# Altium footprint library 2022_AESK_UAV.PcbLib: 25 footprints (part 1 of 2)
Each footprint in its own frame and in the unit in brackets; x right, y up, seen from the top. Pads: shape width x height; smd on the part's side, far side on the other; paste and mask are expansions set on the pad; w line width, h text height; cw(c..) or ccw(c..) is an arc to the next point about the centre after c.
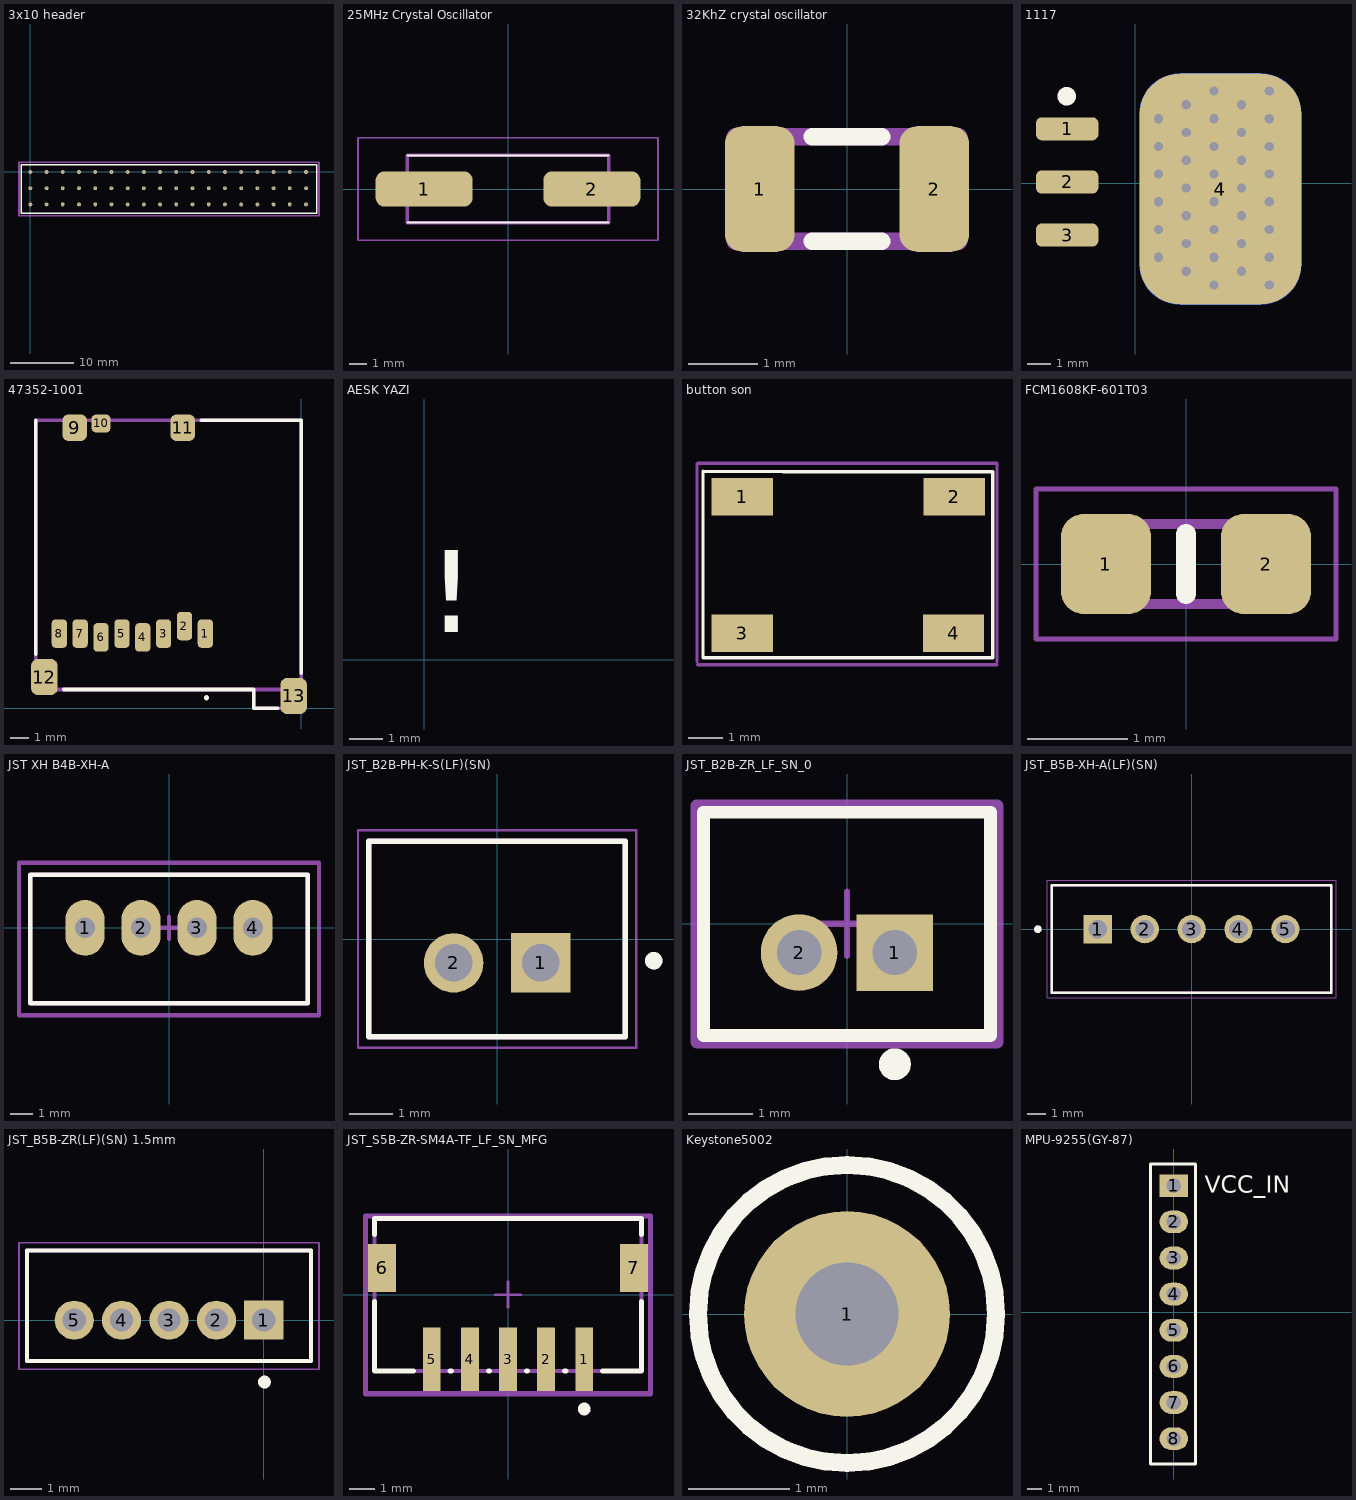
[diagram p0: the footprints below, top view; thin cyan lines are the x and y axes]

## 3x10 header [mm]
pads (55):
  round 0.6 hole 0.3 paste+0: 1(0,0) 1(0,0) 2(2.54,0) 3(5.08,0) 4(7.62,0) 5(10.16,0) 6(12.7,0) 7(15.24,0) 8(17.78,0) 9(20.32,0) 10(22.86,0) 11(25.4,0) 12(27.94,0) 13(30.48,0) 14(33.02,0) 15(35.56,0) 16(38.1,0) 17(40.64,0) 18(43.18,0) 19(0,-2.54) 20(2.54,-2.54) 21(5.08,-2.54) 22(7.62,-2.54) 23(10.16,-2.54) 24(12.7,-2.54) 25(15.24,-2.54) 26(17.78,-2.54) 27(20.32,-2.54) 28(22.86,-2.54) 29(25.4,-2.54) 30(27.94,-2.54) 31(30.48,-2.54) 32(33.02,-2.54) 33(35.56,-2.54) 34(38.1,-2.54) 35(40.64,-2.54) 36(43.18,-2.54) 37(0,-5.08) 38(2.54,-5.08) 39(5.08,-5.08) 40(7.62,-5.08) 41(10.16,-5.08) 42(12.7,-5.08) 43(15.24,-5.08) 44(17.78,-5.08) 45(20.32,-5.08) 46(22.86,-5.08) 47(25.4,-5.08) 48(27.94,-5.08) 49(30.48,-5.08) 50(33.02,-5.08) 51(35.56,-5.08) 52(38.1,-5.08) 53(40.64,-5.08) 54(43.18,-5.08)
Top Overlay:
  lines w0.254: -1.397,-6.477 44.831,-6.477 44.831,1.143 -1.397,1.143 -1.397,-6.477
Mechanical 15:
  lines w0.254: -1.778,-6.858 45.085,-6.858 45.212,-6.858 45.212,1.524 -1.778,1.524 -1.778,-6.858

## 25MHz Crystal Oscillator [mm]
pads (2):
  rrect50% 5.5x2 smd: 1(-4.75,0) 2(4.75,0)
Top Overlay:
  lines w0.1: -5.7,-1.9 5.7,-1.9 ; -5.7,1.9 5.7,1.9
Mechanical 13:
  lines w0.2: -5.7,-1.9 5.7,-1.9 5.7,1.9 -5.7,1.9 -5.7,-1.9
Mechanical 15:
  lines w0.1: -8.5,-2.9 8.5,-2.9 8.5,2.9 -8.5,2.9 -8.5,-2.9
3D body "ECS-250-18-5PX-F-TR.stp": height 4.4, standoff 0, extent -7.3,-1.9 7.3,1.9

## 32KhZ crystal oscillator [mm]
pads (2):
  rrect50% 1x1.8 smd: 1(-1.25,0) 2(1.25,0)
Top Overlay:
  lines w0.254: -0.5,-0.75 0.5,-0.75 ; -0.5,0.75 0.5,0.75
Mechanical 13:
  lines w0.254: -1.6,-0.75 1.6,-0.75 1.6,0.75 -1.6,0.75 -1.6,-0.75
3D body "User Library-NDK_NX3215SA.STEP": height 0.8, standoff 0, extent -1.6,-0.75 1.6,0.75

## 1117 [mm]
pads (5):
  rrect50% 2.7x1 smd paste-0.102 mask+0.051: 1(-2.95,2.351) 2(-2.95,0.051) 3(-2.95,-2.249)
  rrect50% 7x10 smd paste-0.102 mask+0.051: 4(3.683,-0.254)
  rrect50% 7x10 smd far side paste-0.102 mask+0.051: 4(3.683,-0.254)
via 2.198,3.39 diameter 0.8 hole 0.4
via 3.398,3.99 diameter 0.8 hole 0.4
via 4.598,3.39 diameter 0.8 hole 0.4
via 5.798,3.99 diameter 0.8 hole 0.4
via 0.998,2.79 diameter 0.8 hole 0.4
via 2.198,2.19 diameter 0.8 hole 0.4
via 3.398,2.79 diameter 0.8 hole 0.4
via 4.598,2.19 diameter 0.8 hole 0.4
via 5.798,2.79 diameter 0.8 hole 0.4
via 0.998,1.59 diameter 0.8 hole 0.4
via 2.198,0.99 diameter 0.8 hole 0.4
via 3.398,1.59 diameter 0.8 hole 0.4
via 4.598,0.99 diameter 0.8 hole 0.4
via 5.798,1.59 diameter 0.8 hole 0.4
via 0.998,0.39 diameter 0.8 hole 0.4
via 2.198,-0.21 diameter 0.8 hole 0.4
via 3.398,0.39 diameter 0.8 hole 0.4
via 4.598,-0.21 diameter 0.8 hole 0.4
via 5.798,0.39 diameter 0.8 hole 0.4
via 0.998,-0.81 diameter 0.8 hole 0.4
via 2.198,-1.41 diameter 0.8 hole 0.4
via 3.398,-0.81 diameter 0.8 hole 0.4
via 4.598,-1.41 diameter 0.8 hole 0.4
via 5.798,-0.81 diameter 0.8 hole 0.4
via 0.998,-2.01 diameter 0.8 hole 0.4
via 2.198,-2.61 diameter 0.8 hole 0.4
via 3.398,-2.01 diameter 0.8 hole 0.4
via 4.598,-2.61 diameter 0.8 hole 0.4
via 5.798,-2.01 diameter 0.8 hole 0.4
via 0.998,-3.21 diameter 0.8 hole 0.4
via 2.198,-3.81 diameter 0.8 hole 0.4
via 3.398,-3.21 diameter 0.8 hole 0.4
via 4.598,-3.81 diameter 0.8 hole 0.4
via 5.798,-3.21 diameter 0.8 hole 0.4
via 3.398,-4.41 diameter 0.8 hole 0.4
via 5.798,-4.41 diameter 0.8 hole 0.4
Top Overlay:
  circle w0.4: c-2.972,3.759 r0.2
3D body "SW3dPS-SOT-223-1.STEP": height 1.63, standoff -0.02, extent -3.754,-3.25 3.246,3.25

## 47352-1001 [mm]
pads (13):
  rrect50% 0.8x1.5 smd: 1(-5.06,3.94) 2(-6.16,4.34) 3(-7.26,3.94) 4(-8.36,3.74) 5(-9.46,3.94) 6(-10.56,3.74) 7(-11.66,3.94) 8(-12.76,3.94)
  rrect50% 1.3x1.4 smd: 9(-11.95,14.8) 11(-6.25,14.8)
  rrect50% 1x0.95 smd: 10(-10.56,15.025)
  rrect50% 1.4x1.9 smd: 12(-13.55,1.65) 13(-0.4,0.65)
Top Overlay:
  circle w0.2: c-4.994,0.556 r0.034
  lines w0.2: -14,2.872 -14,15.2 ; -12.526,1 -2.5,1 -2.5,0 -1.25,0 ; -5.273,15.2 0,15.2 0,1.858
Mechanical 13:
  lines w0.2: -2.5,1 -2.5,0 0,0 0,1 ; 0,1 -14,1 -14,15.2 0,15.2 0,1
3D body "473521001.stp": height 1.85, standoff -0.03, extent -14.035,0.04 0.065,15.24

## AESK YAZI [mm] "AESK YAZI"
Top Overlay:
  text "!" at 0.006,-0.127 h5

## button son [mm]
pads (4):
  rect 1.8x1.1 smd mask+0.05: 1(9.25,9.35) 2(15.475,9.35) 3(9.25,5.35) 4(15.45,5.35)
Top Overlay:
  lines w0.1: 16.6,10.075 14.3,10.075 10.45,10.075 8.1,10.1 8.1,4.625 16.6,4.625 16.6,10.075 ; 16.6,10.075 16.6,10.075
Mechanical 3:
  lines w0.1: 7.925,4.5 7.925,10.3 7.95,10.325 10.144,10.325 11.241,10.325 13.434,10.325 14.531,10.325 16.725,10.325 16.725,4.5 ; 7.95,4.425 10.5,4.425 14.2,4.425 15.45,4.425 ; 15.425,4.425 15.825,4.425 16.725,4.425
3D body "User Library-4x4_SMD_Switch.step": height 1.5, standoff 0, extent 9.05,4.775 15.45,9.975

## FCM1608KF-601T03 [mm]
pads (2):
  rrect50% 0.9x1 smd: 1(-0.8,0) 2(0.8,0)
Top Overlay:
  lines w0.2: 0,-0.3 0,0.3
Mechanical 13:
  lines w0.1: -0.8,-0.4 -0.8,0.4 0.8,0.4 0.8,-0.4 -0.8,-0.4
Mechanical 15:
  lines w0.05: -1.5,-0.75 -1.5,0.75 1.5,0.75 1.5,-0.75 -1.5,-0.75
3D body "FCM1608KF-601T03.stp": height 0.95, standoff 0, extent -0.8,-0.4 0.8,0.4

## JST XH B4B-XH-A [mm]
pads (4):
  oval 1.75x2.5 hole 0.9: 1(-3.75,0) 2(-1.25,0) 3(1.25,0) 4(3.75,0)
Top Overlay:
  lines w0.2: -6.2,-3.375 -6.2,2.375 6.2,2.375 6.2,-3.375 -6.2,-3.375
Mechanical 1:
  lines w0.2: -6.2,-3.375 6.2,-3.375 6.2,2.375 -6.2,2.375 -6.2,-3.375
Mechanical 15:
  lines w0.2: -0.5,0 0.5,0 ; 0,-0.5 0,0.5 ; -6.7,-3.9 -6.7,2.9 6.7,2.9 6.7,-3.9 -6.7,-3.9
3D body "JST B4B-XH-A.STEP": height 7, standoff -3.4, extent -6.2,-3.375 6.2,2.375

## JST_B2B-PH-K-S(LF)(SN) [mm]
pads (2):
  rect 1.368x1.368 hole 0.86: 1(1,-0.55)
  round 1.368 hole 0.86: 2(-1,-0.55)
Top Overlay:
  circle w0.2: c3.6,-0.5 r0.1
  lines w0.127: -2.95,-2.25 -2.95,2.25 2.95,2.25 2.95,-2.25 -2.95,-2.25
Mechanical 13:
  circle w0.2: c3.6,-0.5 r0.1
  lines w0.127: -2.95,-2.25 2.95,-2.25 2.95,2.25 -2.95,2.25 -2.95,-2.25
Mechanical 15:
  lines w0.05: -3.2,-2.5 3.2,-2.5 3.2,2.5 -3.2,2.5 -3.2,-2.5
3D body "B2B-PH-K-S(LF)(SN)--3DModel-STEP-56544.STEP": height 6, standoff -3.4, extent -2.95,-2.25 2.95,2.25

## JST_B2B-ZR_LF_SN_0 [mm]
pads (2):
  rect 1.2x1.2 hole 0.7 paste-1000 mask+0: 1(0.75,-0.45)
  round 1.2 hole 0.7 paste-1000 mask+0: 2(-0.75,-0.45)
Top Overlay:
  circle w0.25: c0.75,-2.2 r0.125
  lines w0.2: -2.25,-1.75 -2.25,1.75 2.25,1.75 2.25,-1.75 -2.25,-1.75
Mechanical 10:
  lines w0.2: -2.35,-1.85 -2.35,1.85 2.35,1.85 2.35,-1.85 -2.35,-1.85
  text ".Designator" at 0,0 h1
Mechanical 12:
  lines w0.15: -2.25,-1.75 -2.25,1.75 2.25,1.75 2.25,-1.75 -2.25,-1.75
Mechanical 15:
  lines w0.1: -0.5,0 0.5,0 ; 0,-0.5 0,0.5
  lines w0.2: -2.35,-1.85 -2.35,1.85 2.35,1.85 2.35,-1.85 -2.35,-1.85
3D body "Conn_JST_B2B-ZR_LF_SN_eec.STEP": height 0.25, standoff 0, extent -2.35,-1.85 2.35,1.85

## JST_B5B-XH-A(LF)(SN) [mm]
pads (5):
  rect 1.508x1.508 hole 1: 1(-5,0)
  round 1.508 hole 1: 2(-2.5,0) 3(0,0) 4(2.5,0) 5(5,0)
Top Overlay:
  circle w0.2: c-8.2,0 r0.1
  lines w0.127: -7.45,-3.4 7.45,-3.4 7.45,2.35 -7.45,2.35 -7.45,-3.4
Mechanical 13:
  circle w0.2: c-8.2,0 r0.1
  lines w0.127: -7.45,-3.4 7.45,-3.4 7.45,2.35 -7.45,2.35 -7.45,-3.4
Mechanical 15:
  lines w0.05: -7.7,-3.65 -7.7,2.6 7.7,2.6 7.7,-3.65 -7.7,-3.65
3D body "step_temp.STEP": height 7, standoff -3.4, extent -7.45,-3.429 7.45,2.321

## JST_B5B-ZR(LF)(SN) 1.5mm [mm]
pads (5):
  rect 1.238x1.238 hole 0.73: 1(0,0)
  round 1.238 hole 0.73: 2(-1.5,0) 3(-3,0) 4(-4.5,0) 5(-6,0)
Top Overlay:
  circle w0.2: c0.023,-1.958 r0.1
  lines w0.127: -7.5,-1.3 1.5,-1.3 1.5,2.2 -7.5,2.2 -7.5,-1.3
Mechanical 13:
  circle w0.2: c0.023,-1.958 r0.1
  lines w0.127: -7.5,-1.3 1.5,-1.3 1.5,2.2 -7.5,2.2 -7.5,-1.3
Mechanical 15:
  lines w0.05: -7.75,-1.55 1.75,-1.55 1.75,2.45 -7.75,2.45 -7.75,-1.55
3D body "B5B-ZR -LF--SN---3DModel-STEP-56544.STEP": height 4.5, standoff -2.7, extent -7.5,-1.3 1.5,2.2

## JST_S5B-ZR-SM4A-TF_LF_SN_MFG [mm]
pads (7):
  rect 0.7x2.5 smd paste+0 mask+0: 1(3,-2.55) 2(1.5,-2.55) 3(0,-2.55) 4(-1.5,-2.55) 5(-3,-2.55)
  rect 1.1x1.9 smd paste+0 mask+0: 6(-4.95,1.05) 7(4.95,1.05)
Top Overlay:
  circle w0.25: c3,-4.5 r0.125
  lines w0.2: -5.25,-0.275 -5.25,-3 -3.725,-3 ; -5.25,2.375 -5.25,3 5.25,3 5.25,2.375 ; -2.275,-3 -2.225,-3 ; -0.775,-3 -0.725,-3 ; 0.725,-3 0.775,-3 ; 2.225,-3 2.275,-3 ; 3.725,-3 5.25,-3 5.25,-0.275
Mechanical 10:
  lines w0.2: -5.6,-3.9 5.6,-3.9 5.6,3.1 -5.6,3.1 -5.6,-3.9
  text ".Designator" at 0,-0.4 h1
Mechanical 12:
  lines w0.15: -5.25,-3 5.25,-3 5.25,3 -5.25,3 -5.25,-3
Mechanical 15:
  lines w0.1: -0.5,0 0.5,0 ; 0,-0.5 0,0.5
  lines w0.2: -5.6,-3.9 5.6,-3.9 5.6,3.1 -5.6,3.1 -5.6,-3.9
3D body "Conn_JST_S5B-ZR-SM4A-TF_LF_SN_eec.STEP": height 0.25, standoff 0, extent -5.6,-3.9 5.6,3.1

## Keystone5002 [mil] "For Keystone 500x miniature loop terminals"
height 181.1
pads (1):
  round 80 hole 40: 1(0,0)
Top Overlay:
  circle w7: c0,0 r58
Mechanical 5:
  circle w5: c0,0 r58.31
  text ".Designator" at -45,-10 h30
3D body "Keystone_5002.stp": height 181.97, standoff -118.11, extent -49,-49 49.04,49.23

## MPU-9255(GY-87) [mm]
pads (8):
  rect 2x1.6 hole 1: 1(0,8.89)
  oval 2x1.6 hole 1: 2(0,6.35) 3(0,3.81) 4(0,1.27) 5(0,-1.27) 6(0,-3.81) 7(0,-6.35) 8(0,-8.89)
Top Overlay:
  lines w0.2: -1.651,-10.668 -1.651,10.414 1.524,10.414 1.524,-10.668 -1.651,-10.668
  text "VCC_IN" at 2.159,8.382 h1.2
3D body "User Library-MPU 6050 IMU.STEP": height 6.32, standoff -4.85, extent -14.605,-10.681 1.27,10.427